# Altium footprint library cool_library.PcbLib: 1182 footprints (part 74 of 75)
Each footprint in its own frame and in the unit in brackets; x right, y up, seen from the top. Pads: shape width x height; smd on the part's side, far side on the other; paste and mask are expansions set on the pad; w line width, h text height; cw(c..) or ccw(c..) is an arc to the next point about the centre after c.
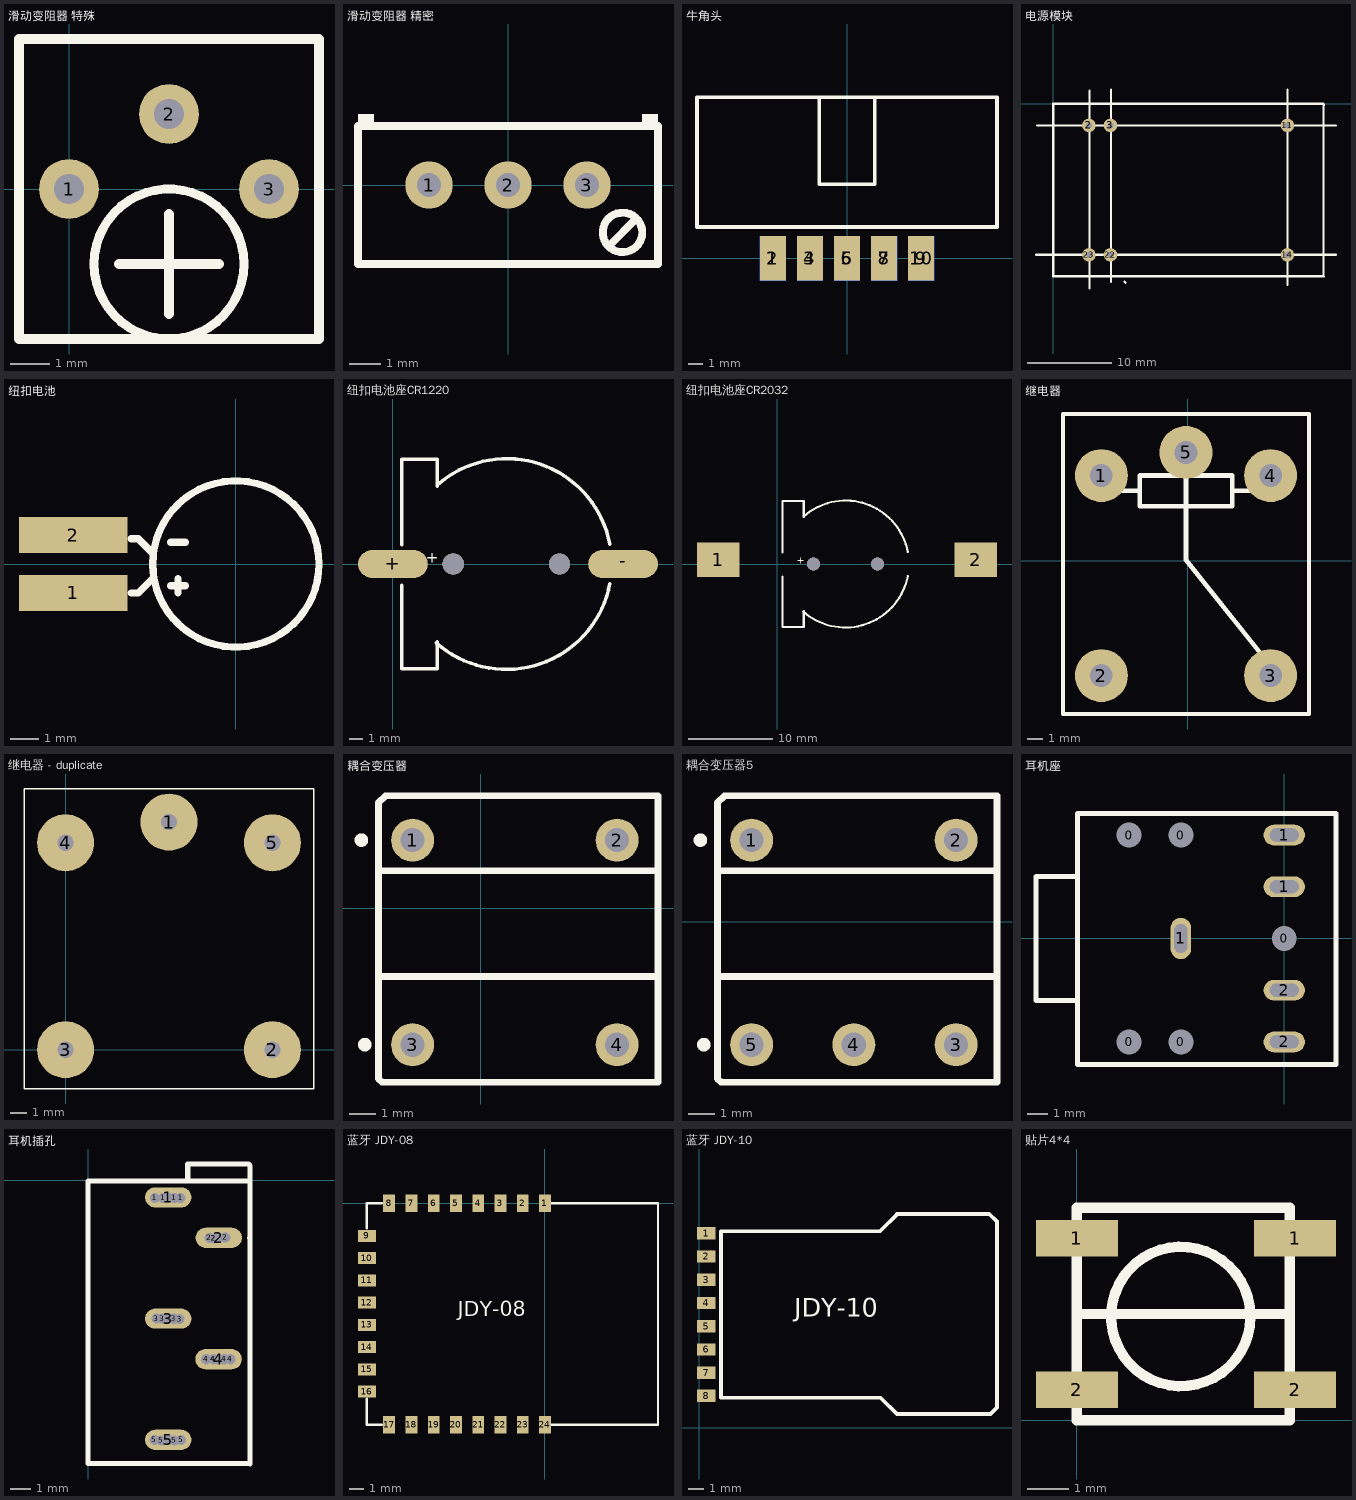
[diagram p73: the footprints below, top view; thin cyan lines are the x and y axes]

## 滑动变阻器 特殊 [mil]
pads (3):
  round 60 hole 30: 1(0,0) 2(100,75) 3(200,0)
Top Overlay:
  circle w9: c100,-75 r75
  lines w10: 50,-75 150,-75 ; 100,-125 100,-25 ; -50,-150 250,-150 250,150 -50,150 -50,0 -50,-150
3D body: height 210, standoff -177.01, extent -87.6,-195 287.6,180.2

## 滑动变阻器 精密 [mil]
pads (3):
  round 60 hole 30: 1(-100,0) 2(0,0) 3(100,0)
Top Overlay:
  circle w10: c145,-60 r25
  rectangle: -190,75 -170,90
  rectangle: 170,75 190,90
  lines w10: 130,-75 160,-45 ; -190,-100 -190,75 190,75 190,-100 -190,-100
3D body: height 375.2, standoff -196.85, extent -187.6,-95 187.6,95.16

## 牛角头 [mil]
height 47.24
pads (10):
  rect 70x120 smd: 1(-200,0) 3(-100,0) 5(0,0) 7(100,0) 9(200,0)
  rect 70x120 smd far side: 2(-200,0) 4(-100,0) 6(0,0) 8(100,0) 10(200,0)
Top Overlay:
  lines w10: -75,435 -75,200 75,200 75,435 ; -405,85 -405,435 405,435 405,85 -405,85

## 电源模块 [mm]
pads (6):
  round 1.6 hole 0.7: 2(4.191,-2.54) 3(6.731,-2.54) 11(27.559,-2.54) 14(27.559,-17.78) 22(6.731,-17.78) 23(4.191,-17.78)
Top Overlay:
  lines w0.254: -2.032,-17.78 33.274,-17.78 ; -1.905,-2.54 33.274,-2.54 ; 4.25,-21.717 4.25,1.524 ; 6.79,-20.955 6.79,1.651 ; 8.382,-20.955 8.509,-21.082 ; 27.55,-21.336 27.55,1.651 ; 31.8,-20.32 31.8,-0.177 ; 31.877,-20.32 31.603,-20.3 0,-20.3 0,0 31.8,0 31.877,-0.177

## 纽扣电池 [mil]
pads (2):
  rect 150x50 smd: 1(-225,-40) 2(-225,40)
Top Overlay:
  circle w10: c0,0 r115
  lines w10: -145,-40 -135,-40 -115,-20 ; -145,35 -135,35 -115,15 ; -90,-30 -70,-30 ; -90,30 -70,30 ; -80,-40 -80,-20

## 纽扣电池座CR1220 [mm] "小的"
height 5
pads (2):
  oval 5x2 smd: +(0,0) -(16.5,0)
via 4.318,0 diameter 1.524 hole 1.524
via 11.938,0 diameter 1.524 hole 1.524
Top Overlay:
  lines w0.254: 0.635,-1.524 0.635,-7.493 3.175,-7.493 3.175,-5.588 ; 0.635,1.397 0.635,7.493 3.175,7.493 3.175,5.588 ; 3.115,-5.655 ccw(c8.128,0) 15.553,-1.408 ; 3.175,5.659 cw(c8.159,0.035) 15.543,1.43
  text "+" at 3.302,0.762 h0.81
3D body: height 3.94, standoff -1, extent -1,-7.5 17.5,7.497

## 纽扣电池座CR2032 [mil]
height 196.85
pads (2):
  rect 200x160 smd: 1(-275,20) 2(930,20)
via 170,0 diameter 60 hole 60
via 470,0 diameter 60 hole 60
Top Overlay:
  lines w10: 25,-60 25,-295 125,-295 125,-220 ; 25,55 25,295 125,295 125,220 ; 122.64,-222.66 ccw(c320,0) 612.32,-55.44 ; 125,222.79 cw(c321.24,1.4) 611.94,56.31
  text "+" at 130,30 h32
3D body: height 208.66, standoff 0, extent -304.92,-373.7 954.92,413.7

## 继电器 [mm]
pads (5):
  round 3.5 hole 1.5: 1(-5.69,5.613) 2(-5.69,-7.595) 3(5.486,-7.595) 4(5.486,5.613) 5(-0.102,7.137)
Top Overlay:
  lines w0.254: -8.23,-10.135 8.026,-10.135 8.026,9.677 -8.23,9.677 -8.23,-10.135
  lines w0.305: -6.198,4.597 -3.15,4.597 ; -5.69,4.597 -5.69,5.613 ; -0.102,7.137 -0.102,0.025 5.994,-7.595 ; 2.946,4.597 5.994,4.597 ; 5.486,4.597 5.486,5.613 ; -3.15,3.581 2.946,3.581 2.946,5.613 -3.15,5.613 -3.15,3.581

## 继电器 - duplicate [mm]
pads (5):
  round 3.5 hole 1: 1(6.35,13.97) 2(12.7,0) 3(0,0) 4(0,12.7) 5(12.7,12.7)
Top Overlay:
  lines w0.08: -2.54,-2.413 -2.54,16.002 15.24,16.002 15.24,-2.413 -2.54,-2.413

## 耦合变压器 [mm]
pads (4):
  round 1.6 hole 0.9: 1(-2.54,2.54) 2(5.08,2.54) 3(-2.54,-5.08) 4(5.08,-5.08)
Top Overlay:
  circle w0.254: c-4.445,2.54 r0.127
  circle w0.254: c-4.318,-5.08 r0.127
  lines w0.254: -3.81,-2.54 6.604,-2.54 ; -3.81,1.397 6.604,1.397 ; -3.81,-6.35 -3.683,-6.477 6.604,-6.477 6.604,4.191 -3.556,4.191 -3.81,3.937 -3.81,-6.35

## 耦合变压器5 [mm]
pads (5):
  round 1.6 hole 0.9: 1(-25.146,3.048) 2(-17.526,3.048) 3(-17.526,-4.572) 4(-21.336,-4.572) 5(-25.146,-4.572)
Top Overlay:
  circle w0.254: c-27.051,3.048 r0.127
  circle w0.254: c-26.924,-4.572 r0.127
  lines w0.254: -26.416,-2.032 -16.002,-2.032 ; -26.416,1.905 -16.002,1.905 ; -26.416,-5.842 -26.289,-5.969 -16.002,-5.969 -16.002,4.699 -26.162,4.699 -26.416,4.445 -26.416,-5.842

## 耳机座 [mm]
pads (10):
  round 0.762 hole 1.204: 0(-7.5,-5) 0(-7.5,5) 0(-5,-5) 0(-5,5)
  round 0.762 hole 1.2: 0(0,0)
  oval 1x2 hole 0.635 slot 1.397 at 90 deg: 1(-5,0)
  oval 2x1 hole 0.635 slot 1.397 at 0 deg: 1(0,2.5) 1(0,5) 2(0,-5) 2(0,-2.5)
Top Overlay:
  lines w0.254: -10,-3 -12,-3 -12,3 -10,3 ; -10,-6.096 -10,6.045 2.5,6.045 2.5,-6.096 -10,-6.096

## 耳机插孔 [mm]
pads (26):
  round 0.5 hole 0.5: 1(3.302,-0.864) 1(3.708,-0.864) 1(4.267,-0.864) 1(4.572,-0.864) 2(5.994,-2.845) 2(6.223,-2.87) 2(6.223,-2.87) 2(6.782,-2.819) 3(3.378,-6.833) 3(3.658,-6.833) 3(4.242,-6.838) 3(4.521,-6.858) 4(5.842,-8.839) 4(6.198,-8.839) 4(6.198,-8.839) 4(6.731,-8.839) 4(7.036,-8.839) 5(3.277,-12.827) 5(3.607,-12.852) 5(4.267,-12.852) 5(4.597,-12.827)
  oval 2.3x1 hole 0.5: 1(3.962,-0.838) 2(6.462,-2.838) 3(3.962,-6.833) 4(6.452,-8.839) 5(3.962,-12.827)
Top Overlay:
  lines w0.254: 4.928,-0.025 4.928,0.813 7.925,0.813 8,0.738 8,-0.229 ; 7.993,-2.838 8,-2.845 ; 7.999,-8.838 8,-8.839 ; 0,-14 7.98,-14 8.001,-14.021 8,-14.02 8,-0.025 0,-0.025 0,-14

## 蓝牙 JDY-08 [mm]
pads (24):
  rect 0.8x1.2 smd: 1(0,0) 2(-1.5,0) 3(-3,0) 4(-4.5,0) 5(-6,0) 6(-7.5,0) 7(-9,0) 8(-10.5,0) 17(-10.5,-14.935) 18(-9,-14.935) 19(-7.5,-14.935) 20(-6,-14.935) 21(-4.5,-14.935) 22(-3,-14.935) 23(-1.5,-14.935) 24(0,-14.935)
  rect 1.2x0.8 smd: 9(-12,-2.202) 10(-12,-3.702) 11(-12,-5.202) 12(-12,-6.702) 13(-12,-8.202) 14(-12,-9.702) 15(-12,-11.202) 16(-12,-12.702)
Top Overlay:
  lines w0.16: -12,-13.176 -12,-14.935 -10.984,-14.935 ; -12,-1.702 -12,0 -10.984,0 ; 0.465,-14.935 1.188,-14.935 7.615,-14.935 7.615,-1.905 7.615,0 2.56,0 0.465,0
  text "JDY-08" at -5.869,-7.604 h1

## 蓝牙 JDY-10 [mm]
pads (8):
  rect 1.2x0.8 smd: 1(0.467,12.56) 2(0.467,11.06) 3(0.467,9.56) 4(0.467,8.06) 5(0.467,6.56) 6(0.467,5.06) 7(0.467,3.56) 8(0.467,2.06)
Top Layer:
  lines w0.17: 0.467,9.56 0.904,9.56 ; 0.882,8.11 0.883,8.109
  lines w0.2: 0.502,11.312 0.528,11.305 0.909,11.21 0.83,11.32 0.782,11.388 ; 0.883,2.244 0.902,2.133 0.914,2.06 0.959,1.787
Top Overlay:
  lines w0.254: 12.778,13.81 18.731,13.81 19.231,13.31 19.231,1.31 18.808,0.887 12.778,0.887 11.721,1.944 1.424,1.944 1.424,12.688 11.681,12.688 12.804,13.81
  text "JDY-10" at 6.149,7.176 h1.2

## 贴片4*4 [mm]
pads (4):
  rect 2x0.9 smd: 1(0,4.45) 1(5.334,4.45) 2(0,0.75) 2(5.334,0.75)
Top Overlay:
  circle w0.254: c2.54,2.54 r1.704
  lines w0.254: 0,2.6 5.14,2.6 5.2,2.54 ; 0,0 0,5.2 5.2,5.2 5.2,0 0,0